# Altium footprint library myLibraryAltium.PcbLib: 215 footprints (part 10 of 14)
Each footprint in its own frame and in the unit in brackets; x right, y up, seen from the top. Pads: shape width x height; smd on the part's side, far side on the other; paste and mask are expansions set on the pad; w line width, h text height; cw(c..) or ccw(c..) is an arc to the next point about the centre after c.
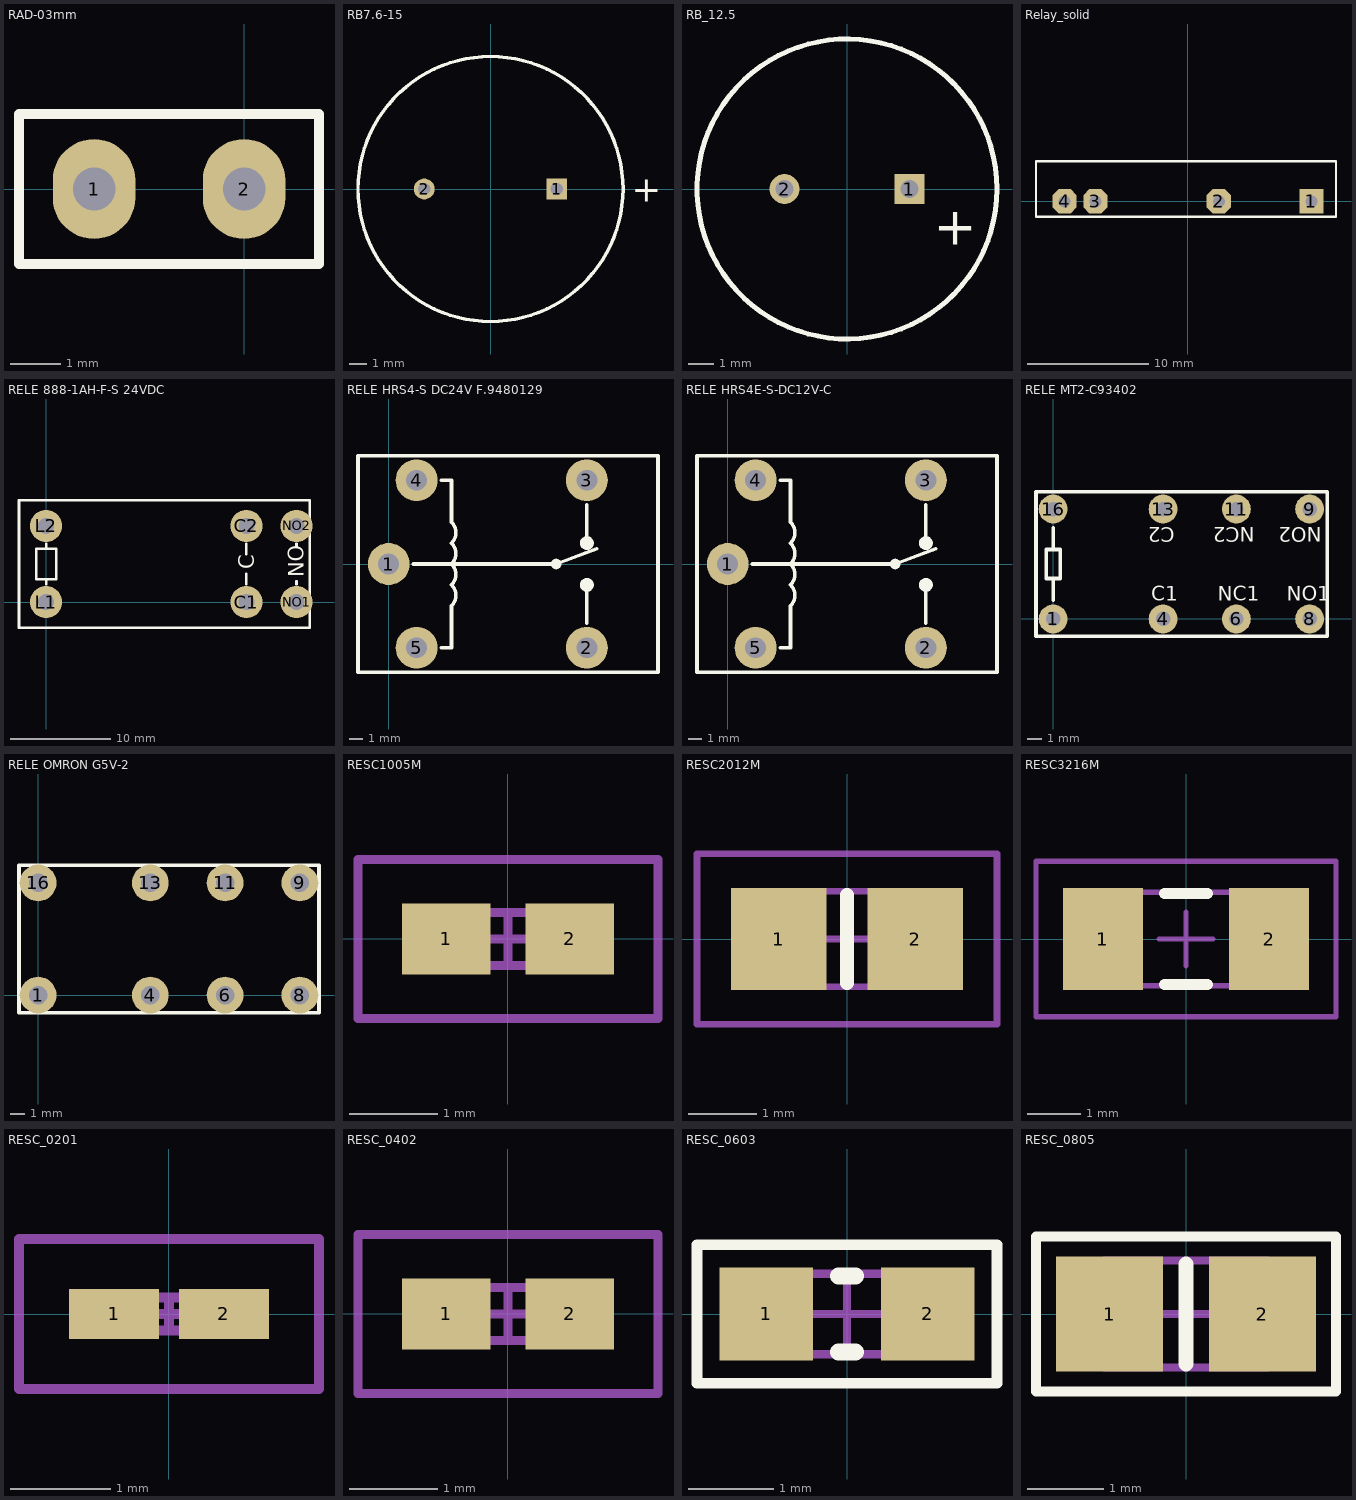
[diagram p9: the footprints below, top view; thin cyan lines are the x and y axes]

## RAD-03mm [mm] "Radial Cap, Thru-Hole; 2 Leads; 0.2 in Pin Spacing"
pads (2):
  oval 1.65x2 hole 0.85: 1(-3,0) 2(0,0)
Top Overlay:
  lines w0.2: -4.5,-1.5 1.5,-1.5 1.5,1.5 -4.5,1.5 -4.5,-1.5

## RB7.6-15 [mm] "Polarized Capacitor (Radial); 2 Leads"
pads (2):
  rect 1.2x1.2 hole 0.7: 1(3.81,0)
  round 1.2 hole 0.7: 2(-3.81,0)
Top Overlay:
  circle w0.2: c0,0 r7.62
  text "+" at 8.132,-0.737 h1.5

## RB_12.5 [mm] "Polarized Capacitor (Radial); 2 Leads"
pads (2):
  rect 1.2x1.2 hole 0.7: 1(2.5,0)
  round 1.2 hole 0.7: 2(-2.5,0)
Top Overlay:
  circle w0.2: c0,0 r6
  text "+" at 3.48,-2.235 h1.5
3D body "User Library-CAPAER_D125_L250_P050_W006X030.STEP": height 6.25, standoff -6.25, extent -6.235,-1.019 6.275,27.001

## Relay_solid [mm]
pads (4):
  rect 2x2 hole 1: 1(10.16,0)
  oct 2x2 hole 1: 2(2.54,0) 3(-7.62,0) 4(-10.16,0)
Top Overlay:
  lines w0.2: -12.514,-1.27 12.185,-1.27 12.185,3.3 -12.514,3.3 -12.514,-1.27
3D body "g3mc-201p_5dc.stp": height 14.3, standoff -3.5, extent -12.417,-1.217 12.083,3.283

## RELE 888-1AH-F-S 24VDC [mm]
pads (6):
  round 3.2 hole 1.6: C1(20,0) C2(20,7.6) L1(0,0) L2(0,7.6) NO1(25,0) NO2(25,7.6)
Top Overlay:
  lines w0.254: 0,1.8 0,2.3 ; 0,5.8 0,5.3 ; 20,1.8 20,2.8 ; 20,4.8 20,5.8 ; 25,1.8 25,2.1 ; 25,5.5 25,5.8 ; 0,2.3 1,2.3 1,5.3 0,5.3 ; 0,2.3 -1,2.3 -1,5.3 0,5.3 ; -2.7,-2.55 26.3,-2.55 26.3,10.15 -2.7,10.15 -2.7,-2.55
  text "NO" at 25.72,2.5 h1.52
  text "C" at 20.8,3.292 h1.52

## RELE HRS4-S DC24V F.9480129 [mm] "RELE DC24V"
pads (5):
  round 3 hole 1.5: 1(0,0) 2(14.2,-6) 3(14.2,6) 4(2,6) 5(2,-6)
Top Overlay:
  circle w0.254: c12,0 r0.25
  circle w0.5: c14.2,1.5 r0.25
  circle w0.5: c14.2,-1.5 r0.25
  lines w0.254: 1.75,0 12,0 14.91,1.092 ; 3.75,-6 4.5,-6 4.5,-3 ccw(c3.75,-2.25) 4.5,-1.5 ccw(c3.75,-0.75) 4.5,0 ccw(c3.75,0.75) 4.5,1.5 ccw(c3.75,2.25) 4.5,3 4.5,6 3.75,6 ; 14.2,-4.25 14.2,-1.5 ; 14.2,1.5 14.2,4.25 ; -2.2,-7.75 19.3,-7.75 19.3,7.75 -2.2,7.75 -2.2,-7.75

## RELE HRS4E-S-DC12V-C [mm] "RELE DC12V"
pads (5):
  round 3 hole 1.5: 1(0,0) 2(14.2,-6) 3(14.2,6) 4(2,6) 5(2,-6)
Top Overlay:
  circle w0.5: c14.2,-1.5 r0.25
  circle w0.5: c14.2,1.5 r0.25
  circle w0.254: c12,0 r0.25
  lines w0.254: 1.75,0 12,0 14.91,1.092 ; 3.75,-6 4.5,-6 4.5,-3 ccw(c3.75,-2.25) 4.5,-1.5 ccw(c3.75,-0.75) 4.5,0 ccw(c3.75,0.75) 4.5,1.5 ccw(c3.75,2.25) 4.5,3 4.5,6 3.75,6 ; 14.2,-4.25 14.2,-1.5 ; 14.2,1.5 14.2,4.25 ; -2.2,-7.75 -2.2,7.75 19.3,7.75 19.3,-7.75 -2.2,-7.75

## RELE MT2-C93402 [mm] "RELE 12VDC"
pads (8):
  round 2 hole 1: 1(0,0) 4(7.62,0) 6(12.7,0) 8(17.78,0) 9(17.78,7.62) 11(12.7,7.62) 13(7.62,7.62) 16(0,7.62)
Top Overlay:
  lines w0.254: 0,1.31 0,2.81 ; 0,6.31 0,4.81 ; 0,2.81 -0.49,2.81 -0.49,4.81 0,4.81 ; 0,2.81 0.49,2.81 0.49,4.81 0,4.81 ; -1.19,-1.19 -1.19,8.81 19.01,8.81 19.01,-1.19 -1.19,-1.19
  text "C1" at 6.81,1.27 h1
  text "NC1" at 11.41,1.27 h1
  text "NO1" at 16.21,1.27 h1
  text "C2" at 8.43,6.35 h1
  text "NC2" at 13.99,6.35 h1
  text "NO2" at 18.61,6.35 h1

## RELE OMRON G5V-2 [mm]
pads (8):
  round 2.5 hole 1.25: 1(0,0) 4(7.62,0) 6(12.7,0) 8(17.78,0) 9(17.78,7.62) 11(12.7,7.62) 13(7.62,7.62) 16(0,7.62)
Top Overlay:
  lines w0.254: -1.3,-1.2 19.08,-1.2 19.08,8.82 -1.3,8.82 -1.3,-1.2

## RESC1005M [mm] "Chip Resistor, Body 1.1x0.5mm, IPC Low Density"
height 0.4
pads (2):
  rect 1x0.8 smd: 1(-0.7,0) 2(0.7,0)
Mechanical 13:
  lines w0.1: -0.55,-0.3 0.55,-0.3 0.55,0.3 -0.55,0.3 -0.55,-0.3
Mechanical 15:
  lines w0.1: -0.3,0 0.3,0 ; 0,-0.3 0,0.3 ; -1.7,-0.9 1.7,-0.9 1.7,0.9 -1.7,0.9 -1.7,-0.9
3D body: height 0.4, standoff 0, extent -0.55,-0.3 0.55,0.3

## RESC2012M [mm] "Chip Resistor, Body 2.0x1.3mm, IPC Low Density"
height 0.65
pads (2):
  rect 1.4x1.5 smd: 1(-1,0) 2(1,0)
Top Overlay:
  lines w0.2: 0,-0.65 0,0.65
Mechanical 13:
  lines w0.1: -1.075,-0.7 -1.075,0.7 1.075,0.7 1.075,-0.7 -1.075,-0.7
Mechanical 15:
  lines w0.1: -0.5,0 0.5,0 ; 0,-0.5 0,0.5 ; -2.2,-1.25 -2.2,1.25 2.2,1.25 2.2,-1.25 -2.2,-1.25
3D body: height 0.65, standoff 0, extent -1.075,-0.7 1.075,0.7

## RESC3216M [mm] "Chip Resistor, Body 3.2x1.6mm, IPC Low Density"
height 0.71
pads (2):
  rect 1.5x1.9 smd: 1(-1.55,0) 2(1.55,0)
Top Overlay:
  lines w0.2: -0.4,-0.85 0.4,-0.85 ; -0.4,0.85 0.4,0.85
Mechanical 13:
  lines w0.1: -1.675,-0.875 1.675,-0.875 1.675,0.875 -1.675,0.875 -1.675,-0.875
Mechanical 15:
  lines w0.1: -0.5,0 0.5,0 ; 0,-0.5 0,0.5 ; -2.8,-1.45 2.8,-1.45 2.8,1.45 -2.8,1.45 -2.8,-1.45
3D body: height 0.71, standoff 0, extent -1.675,-0.875 1.675,0.875

## RESC_0201 [mm] "Chip Resistor, Body 0.6x0.3mm, IPC Low Density"
height 0.3
pads (2):
  rect 0.9x0.5 smd: 1(-0.55,0) 2(0.55,0)
Mechanical 13:
  lines w0.1: -0.315,-0.165 0.315,-0.165 0.315,0.165 -0.315,0.165 -0.315,-0.165
Mechanical 15:
  lines w0.1: -0.165,0 0.165,0 ; 0,-0.165 0,0.165 ; -1.5,-0.75 1.5,-0.75 1.5,0.75 -1.5,0.75 -1.5,-0.75
3D body: height 0.3, standoff 0, extent -0.315,-0.165 0.315,0.165

## RESC_0402 [mm] "Chip Resistor, Body 1.1x0.5mm, IPC Low Density"
height 0.4
pads (2):
  rect 1x0.8 smd: 1(-0.7,0) 2(0.7,0)
Mechanical 13:
  lines w0.1: -0.55,-0.3 0.55,-0.3 0.55,0.3 -0.55,0.3 -0.55,-0.3
Mechanical 15:
  lines w0.1: -0.3,0 0.3,0 ; 0,-0.3 0,0.3 ; -1.7,-0.9 1.7,-0.9 1.7,0.9 -1.7,0.9 -1.7,-0.9
3D body: height 0.4, standoff 0, extent -0.55,-0.3 0.55,0.3

## RESC_0603 [mm] "Chip Resistor, Body 1.6x0.8mm, IPC Low Density"
height 0.6
pads (2):
  rect 1.1x1.1 smd: 1(-0.95,0) 2(0.95,0)
Top Overlay:
  lines w0.127: -1.765,-0.816 -1.765,0.816 1.765,0.816 1.765,-0.816 -1.765,-0.816
  lines w0.2: -0.1,-0.45 0.1,-0.45 ; -0.1,0.45 0.1,0.45
Mechanical 13:
  lines w0.1: -0.85,-0.475 -0.85,0.475 0.85,0.475 0.85,-0.475 -0.85,-0.475
Mechanical 15:
  lines w0.1: -0.475,0 0.475,0 ; 0,-0.475 0,0.475
3D body: height 0.6, standoff 0, extent -0.85,-0.475 0.85,0.475

## RESC_0805 [mm] "Chip Resistor, Body 2.0x1.3mm, IPC Low Density"
height 0.65
pads (2):
  rect 1.4x1.5 smd: 1(-1,0) 2(1,0)
Top Overlay:
  lines w0.127: -1.965,-1.015 -1.965,1.015 1.965,1.015 1.965,-1.015 -1.965,-1.015
  lines w0.2: 0,-0.65 0,0.65
Mechanical 13:
  lines w0.1: -1.075,-0.7 1.075,-0.7 1.075,0.7 -1.075,0.7 -1.075,-0.7
Mechanical 15:
  lines w0.1: -0.5,0 0.5,0 ; 0,-0.5 0,0.5
3D body: height 0.65, standoff 0, extent -1.075,-0.7 1.075,0.7